# Altium footprint library IC.PcbLib: 163 footprints (part 11 of 11)
Each footprint in its own frame and in the unit in brackets; x right, y up, seen from the top. Pads: shape width x height; smd on the part's side, far side on the other; paste and mask are expansions set on the pad; w line width, h text height; cw(c..) or ccw(c..) is an arc to the next point about the centre after c.
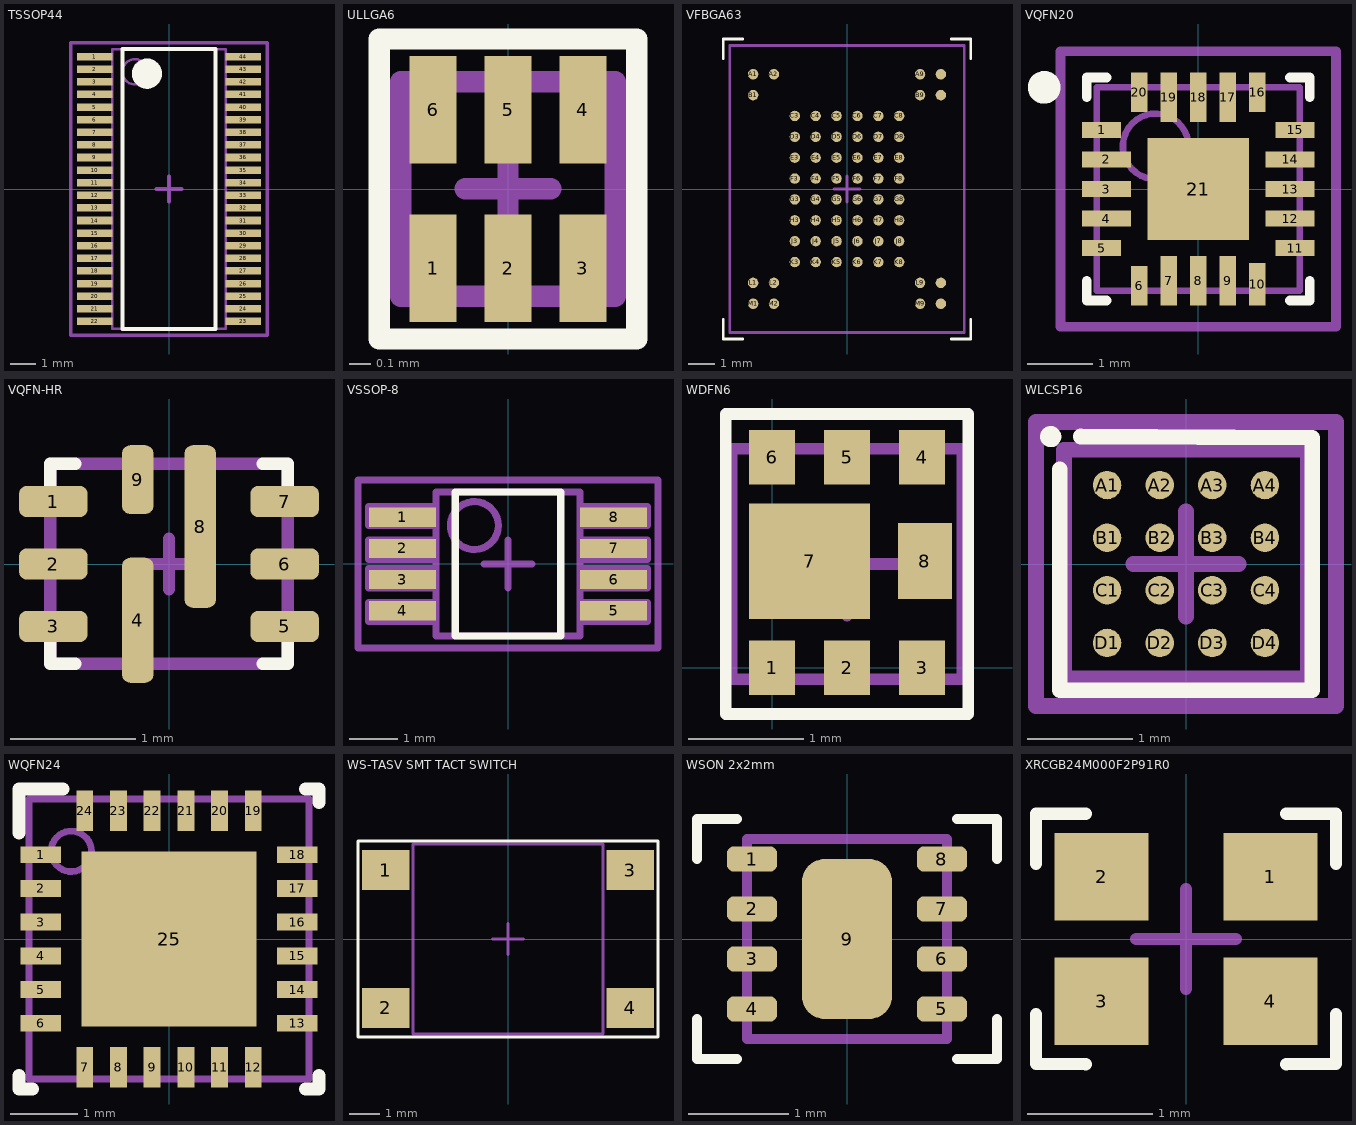
[diagram p10: the footprints below, top view; thin cyan lines are the x and y axes]

## TSSOP44 [mm] "TSSOP, 44-Leads, Body 11,00x4,40mm, Pitch 0,50mm, IPC Medium Density"
height 1.2
pads (44):
  rect 1.4x0.3 smd: 1(-2.95,5.25) 2(-2.95,4.75) 3(-2.95,4.25) 4(-2.95,3.75) 5(-2.95,3.25) 6(-2.95,2.75) 7(-2.95,2.25) 8(-2.95,1.75) 9(-2.95,1.25) 10(-2.95,0.75) 11(-2.95,0.25) 12(-2.95,-0.25) 13(-2.95,-0.75) 14(-2.95,-1.25) 15(-2.95,-1.75) 16(-2.95,-2.25) 17(-2.95,-2.75) 18(-2.95,-3.25) 19(-2.95,-3.75) 20(-2.95,-4.25) 21(-2.95,-4.75) 22(-2.95,-5.25) 23(2.95,-5.25) 24(2.95,-4.75) 25(2.95,-4.25) 26(2.95,-3.75) 27(2.95,-3.25) 28(2.95,-2.75) 29(2.95,-2.25) 30(2.95,-1.75) 31(2.95,-1.25) 32(2.95,-0.75) 33(2.95,-0.25) 34(2.95,0.25) 35(2.95,0.75) 36(2.95,1.25) 37(2.95,1.75) 38(2.95,2.25) 39(2.95,2.75) 40(2.95,3.25) 41(2.95,3.75) 42(2.95,4.25) 43(2.95,4.75) 44(2.95,5.25)
Top Overlay:
  circle w0.6: c-0.875,4.575 r0.3
  lines w0.15: -1.85,-5.55 1.85,-5.55 1.85,5.55 -1.85,5.55 -1.85,-5.55
  text "." at -3,5.9 h0.1
Mechanical 2:
  circle w0.1: c-1.35,4.65 r0.5
  lines w0.1: -2.25,-5.55 2.25,-5.55 2.25,5.55 -2.25,5.55 -2.25,-5.55
Mechanical 15:
  lines w0.15: -0.5,0 0.5,0 ; 0,-0.5 0,0.5 ; -3.9,-5.8 -3.9,5.8 3.9,5.8 3.9,-5.8 -3.9,-5.8
3D body: height 1.2, standoff 0, extent -3.2,-5.55 3.2,5.55

## ULLGA6 [mm]
pads (6):
  rect 0.22x0.5 smd: 1(-0.35,-0.37) 2(0,-0.37) 3(0.35,-0.37) 4(0.35,0.37) 5(0,0.37) 6(-0.35,0.37)
Top Overlay:
  lines w0.1: -0.6,-0.7 -0.6,0.7 0.6,0.7 0.6,-0.7 -0.6,-0.7
Mechanical 32:
  lines w0.1: -0.2,0 0.2,0 ; 0,-0.2 0,0.2 ; -0.5,-0.5 -0.5,0.5 0.5,0.5 0.5,-0.5 -0.5,-0.5
3D body: height 0.4, standoff 0.05, extent -0.5,-0.5 0.5,0.5

## VFBGA63 [mm]
pads (63):
  round 0.4 smd: A1(-3.6,4.4) A2(-2.8,4.4) A9(2.8,4.4) A10(3.6,4.4) B1(-3.6,3.6) B9(2.8,3.6) B10(3.6,3.6) C3(-2,2.8) C4(-1.2,2.8) C5(-0.4,2.8) C6(0.4,2.8) C7(1.2,2.8) C8(2,2.8) D3(-2,2) D4(-1.2,2) D5(-0.4,2) D6(0.4,2) D7(1.2,2) D8(2,2) E3(-2,1.2) E4(-1.2,1.2) E5(-0.4,1.2) E6(0.4,1.2) E7(1.2,1.2) E8(2,1.2) F3(-2,0.4) F4(-1.2,0.4) F5(-0.4,0.4) F6(0.4,0.4) F7(1.2,0.4) F8(2,0.4) G3(-2,-0.4) G4(-1.2,-0.4) G5(-0.4,-0.4) G6(0.4,-0.4) G7(1.2,-0.4) G8(2,-0.4) H3(-2,-1.2) H4(-1.2,-1.2) H5(-0.4,-1.2) H6(0.4,-1.2) H7(1.2,-1.2) H8(2,-1.2) J3(-2,-2) J4(-1.2,-2) J5(-0.4,-2) J6(0.4,-2) J7(1.2,-2) J8(2,-2) K3(-2,-2.8) K4(-1.2,-2.8) K5(-0.4,-2.8) K6(0.4,-2.8) K7(1.2,-2.8) K8(2,-2.8) L1(-3.6,-3.6) L2(-2.8,-3.6) L9(2.8,-3.6) L10(3.6,-3.6) M1(-3.6,-4.4) M2(-2.8,-4.4) M9(2.8,-4.4) M10(3.6,-4.4)
Top Overlay:
  lines w0.1: -4.75,-5 -4.75,-5.75 -4,-5.75 ; -4.75,5 -4.75,5.75 -4,5.75 ; 4,-5.75 4.75,-5.75 4.75,-5 ; 4,5.75 4.75,5.75 4.75,5
Mechanical 32:
  lines w0.1: -0.5,0 0.5,0 ; 0,-0.5 0,0.5 ; -4.5,-5.5 -4.5,5.5 4.5,5.5 4.5,-5.5 -4.5,-5.5
3D body: height 1, standoff 0.55, extent -4.5,-5.5 4.5,5.5

## VQFN20 [mm] "VQFN, 20-Leads, Body 3,00x3,00mm, Pitch 0,45mm, Thermal Pad 1,55x1,55mm, IPC Medium Density"
height 0.85
pads (21):
  rect 0.6x0.25 smd: 1(-1.475,0.9) 5(-1.475,-0.9) 11(1.475,-0.9) 15(1.475,0.9)
  rect 0.75x0.25 smd: 2(-1.4,0.45) 3(-1.4,0) 4(-1.4,-0.45) 12(1.4,-0.45) 13(1.4,0) 14(1.4,0.45)
  rect 0.25x0.6 smd: 6(-0.9,-1.475) 16(0.9,1.475) 20(-0.9,1.475)
  rect 0.25x0.75 smd: 7(-0.45,-1.4) 8(0,-1.4) 9(0.45,-1.4) 17(0.45,1.4) 18(0,1.4) 19(-0.45,1.4)
  rect 0.25x0.65 smd: 10(0.9,-1.45)
  rect 1.55x1.55 smd: 21(0,0)
Top Overlay:
  circle w0.25: c-2.35,1.55 r0.125
  lines w0.15: -1.7,-1.4 -1.7,-1.7 -1.4,-1.7 ; -1.7,1.4 -1.7,1.7 -1.4,1.7 ; 1.4,-1.7 1.7,-1.7 1.7,-1.4 ; 1.4,1.7 1.7,1.7 1.7,1.4
Mechanical 2:
  circle w0.1: c-0.65,0.65 r0.5
  lines w0.1: -1.55,-1.55 1.55,-1.55 1.55,1.55 -1.55,1.55 -1.55,-1.55
Mechanical 15:
  lines w0.15: -0.5,0 0.5,0 ; 0,-0.5 0,0.5 ; -2.1,-2.1 -2.1,2.1 2.1,2.1 2.1,-2.1 -2.1,-2.1
3D body: height 0.85, standoff 0, extent -1.57,-1.57 1.57,1.57

## VQFN-HR [mm]
pads (9):
  rrect50% 0.55x0.25 smd: 1(-0.925,0.5) 2(-0.925,0) 3(-0.925,-0.5) 5(0.925,-0.5) 6(0.925,0) 7(0.925,0.5)
  rrect50% 0.25x1 smd: 4(-0.25,-0.45)
  rrect50% 0.25x1.3 smd: 8(0.25,0.3)
  rrect50% 0.25x0.55 smd: 9(-0.25,0.675)
Top Overlay:
  lines w0.1: -0.95,-0.6 -0.95,-0.8 -0.75,-0.8 ; -0.95,0.6 -0.95,0.8 -0.75,0.8 ; 0.75,-0.8 0.95,-0.8 0.95,-0.6 ; 0.75,0.8 0.95,0.8 0.95,0.6
Mechanical 32:
  lines w0.1: -0.2,0 0.2,0 ; 0,-0.2 0,0.2 ; -0.95,-0.8 0.95,-0.8 0.95,0.8 -0.95,0.8 -0.95,-0.8
3D body: height 1, standoff 0.05, extent -0.95,-0.8 0.95,0.8

## VSSOP-8 [mm] "TSOP, 8-Leads, Body 3,00x3,00mm, Pitch 0,65mm, IPC Medium Density"
height 1.1
pads (8):
  rect 1.4x0.4 smd: 1(-2.2,0.975) 2(-2.2,0.325) 3(-2.2,-0.325) 4(-2.2,-0.975) 5(2.2,-0.975) 6(2.2,-0.325) 7(2.2,0.325) 8(2.2,0.975)
Top Overlay:
  lines w0.15: -1.1,-1.5 -1.1,1.5 1.1,1.5 1.1,-1.5 -1.1,-1.5
  text "." at -2.2,1.7 h0.1
Mechanical 13:
  lines w0.15: -1.5,-1.5 -1.5,1.5 1.5,1.5 1.5,-1.5 -1.5,-1.5
Mechanical 15:
  lines w0.15: -0.5,0 0.5,0 ; 0,-0.5 0,0.5 ; -3.125,-1.75 -3.125,1.75 3.125,1.75 3.125,-1.75 -3.125,-1.75
Mechanical 29:
  circle w0.15: c-0.7,0.8 r0.5
  lines w0.15: -1.5,-1.2 -2.9,-1.2 -2.9,-0.8 -1.5,-0.8 ; -1.5,-0.5 -2.9,-0.5 -2.9,-0.1 -1.5,-0.1 ; -1.5,0.1 -2.9,0.1 -2.9,0.5 -1.5,0.5 ; -1.5,0.8 -2.9,0.8 -2.9,1.2 -1.5,1.2 ; 1.5,-1.2 2.9,-1.2 2.9,-0.8 1.5,-0.8 ; 1.5,-0.5 2.9,-0.5 2.9,-0.1 1.5,-0.1 ; 1.5,0.1 2.9,0.1 2.9,0.5 1.5,0.5 ; 1.5,0.8 2.9,0.8 2.9,1.2 1.5,1.2 ; -1.5,-1.5 1.5,-1.5 1.5,1.5 -1.5,1.5 -1.5,-1.5
3D body: height 1.1, standoff 0, extent -2.45,-1.5 2.45,1.5

## WDFN6 [mm]
height 0.8
pads (8):
  rect 0.4x0.47 smd: 1(0,0) 2(0.65,0) 3(1.3,0) 4(1.3,1.825) 5(0.65,1.825) 6(0,1.825)
  rect 1.05x1 smd: 7(0.325,0.925)
  rect 0.47x0.66 smd: 8(1.325,0.925)
Top Overlay:
  lines w0.1: -0.4,-0.4 -0.4,2.2 1.7,2.2 1.7,-0.4 -0.4,-0.4
Mechanical 32:
  lines w0.1: 0.2,0.9 0.65,0.9 ; 0.65,0.45 0.65,0.9 ; 0.65,1.35 0.65,0.9 ; 1.1,0.9 0.65,0.9 ; -0.35,-0.1 -0.35,1.9 1.65,1.9 1.65,-0.1 -0.35,-0.1
3D body: height 0.9, standoff 0.1, extent -0.35,-0.1 1.65,1.9

## WLCSP16 [mm] "BGA, 16-Leads, Body 2,32x2,17mmx0,60mm, Pitch 0,50mm"
height 0.6
pads (16):
  round 0.27 smd: A1(-0.75,0.75) A2(-0.25,0.75) A3(0.25,0.75) A4(0.75,0.75) B1(-0.75,0.25) B2(-0.25,0.25) B3(0.25,0.25) B4(0.75,0.25) C1(-0.75,-0.25) C2(-0.25,-0.25) C3(0.25,-0.25) C4(0.75,-0.25) D1(-0.75,-0.75) D2(-0.25,-0.75) D3(0.25,-0.75) D4(0.75,-0.75)
Top Overlay:
  circle w0.1: c-1.285,1.21 r0.05
  lines w0.15: -1.2,0.9 -1.2,-1.2 1.2,-1.2 1.2,1.2 -1,1.21
Mechanical 13:
  lines w0.15: -1.16,-1.085 1.16,-1.085 1.16,1.085 -1.16,1.085 -1.16,-1.085
Mechanical 15:
  lines w0.15: -0.5,0 0.5,0 ; 0,-0.5 0,0.5 ; -1.425,-1.35 1.425,-1.35 1.425,1.35 -1.425,1.35 -1.425,-1.35
3D body: height 0.6, standoff 0, extent -1.16,-1.085 1.16,1.085

## WQFN24 [mm]
pads (25):
  rect 0.6x0.25 smd paste+0 mask+0.051: 1(-1.9,1.25) 2(-1.9,0.75) 3(-1.9,0.25) 4(-1.9,-0.25) 5(-1.9,-0.75) 6(-1.9,-1.25) 13(1.9,-1.25) 14(1.9,-0.75) 15(1.9,-0.25) 16(1.9,0.25) 17(1.9,0.75) 18(1.9,1.25)
  rect 0.25x0.6 smd paste+0 mask+0.051: 7(-1.25,-1.9) 8(-0.75,-1.9) 9(-0.25,-1.9) 10(0.25,-1.9) 11(0.75,-1.9) 12(1.25,-1.9) 19(1.25,1.9) 20(0.75,1.9) 21(0.25,1.9) 22(-0.25,1.9) 23(-0.75,1.9) 24(-1.25,1.9)
  rect 2.6x2.6 smd paste-1.287 mask+0.051: 25(0,0)
Top Overlay:
  lines w0.2: -2.225,-2.025 -2.225,-2.225 -2.025,-2.225 ; -2.225,1.575 -2.225,2.225 -1.575,2.225 ; 2.025,-2.225 2.225,-2.225 2.225,-2.025 ; 2.025,2.225 2.225,2.225 2.225,2.025
Bottom Paste:
  region: 0.1,-0.1 0.1,-1.248 1.248,-1.248 1.248,-0.1
  region: -0.1,-1.248 -0.1,-0.1 -1.248,-0.1 -1.248,-1.248
  region: -0.1,0.1 -0.1,1.248 -1.248,1.248 -1.248,0.1
  region: 0.1,1.248 0.1,0.1 1.248,0.1 1.248,1.248
Mechanical 13:
  circle w0.1: c-1.45,1.3 r0.3
  lines w0.1: -2.075,-2.075 -2.075,2.075 2.075,2.075 2.075,-2.075 -2.075,-2.075
3D body: height 0.8, standoff 0.1, extent -2,-2 2,2

## WS-TASV SMT TACT SWITCH [mm]
pads (4):
  rect 1.55x1.3 smd: 1(-4,2.25) 2(-4,-2.25) 3(4,2.25) 4(4,-2.25)
Top Overlay:
  lines w0.1: -4.9,-3.2 -4.9,3.2 4.9,3.2 4.9,-3.2 -4.9,-3.2
Mechanical 32:
  lines w0.1: -0.5,0 0.5,0 ; 0,-0.5 0,0.5 ; -3.1,-3.1 -3.1,3.1 3.1,3.1 3.1,-3.1 -3.1,-3.1
3D body: height 5, standoff 0, extent -1.75,-1.75 1.75,1.75
3D body: height 0.3, standoff 0.1, extent -4.5,-2.6 -3.1,-1.9
3D body: height 0.3, standoff 0.1, extent -4.5,1.9 -3.1,2.6
3D body: height 0.3, standoff 0.1, extent 3.1,-2.6 4.5,-1.9
3D body: height 0.3, standoff 0.1, extent 3.1,1.9 4.5,2.6
3D body: height 3.3, standoff 0.1, extent -3.1,-3.1 3.1,3.1

## WSON 2x2mm [mm]
pads (9):
  rrect50% 0.5x0.25 smd: 1(-0.95,0.8) 2(-0.95,0.3) 3(-0.95,-0.2) 4(-0.95,-0.7) 5(0.95,-0.7) 6(0.95,-0.2) 7(0.95,0.3) 8(0.95,0.8)
  rrect50% 0.9x1.6 smd: 9(0,0)
Top Overlay:
  lines w0.1: -1.5,-0.8 -1.5,-1.2 -1.1,-1.2 ; -1.5,0.8 -1.5,1.2 -1.1,1.2 ; 1.1,-1.2 1.5,-1.2 1.5,-0.8 ; 1.1,1.2 1.5,1.2 1.5,0.8
Mechanical 32:
  lines w0.1: -0.2,0 0.2,0 ; 0,-0.2 0,0.2 ; -1,-1 1,-1 1,1 -1,1 -1,-1
3D body: height 0.8, standoff 0.1, extent -1,-1 1,1

## XRCGB24M000F2P91R0 [mm]
pads (4):
  rect 0.75x0.7 smd: 1(0.675,0.5) 2(-0.675,0.5) 3(-0.675,-0.5) 4(0.675,-0.5)
Top Overlay:
  lines w0.1: -1.2,-0.6 -1.2,-1 -0.8,-1 ; -1.2,0.6 -1.2,1 -0.8,1 ; 0.8,-1 1.2,-1 1.2,-0.6 ; 0.8,1 1.2,1 1.2,0.6
Mechanical 32:
  lines w0.1: -0.4,0 0.4,0 ; 0,-0.4 0,0.4
3D body: height 0.65, standoff 0.1, extent -1,-0.8 1,0.8